# Altium footprint library 方林 封装库.PcbLib: 101 footprints (part 1 of 7)
Each footprint in its own frame and in the unit in brackets; x right, y up, seen from the top. Pads: shape width x height; smd on the part's side, far side on the other; paste and mask are expansions set on the pad; w line width, h text height; cw(c..) or ccw(c..) is an arc to the next point about the centre after c.
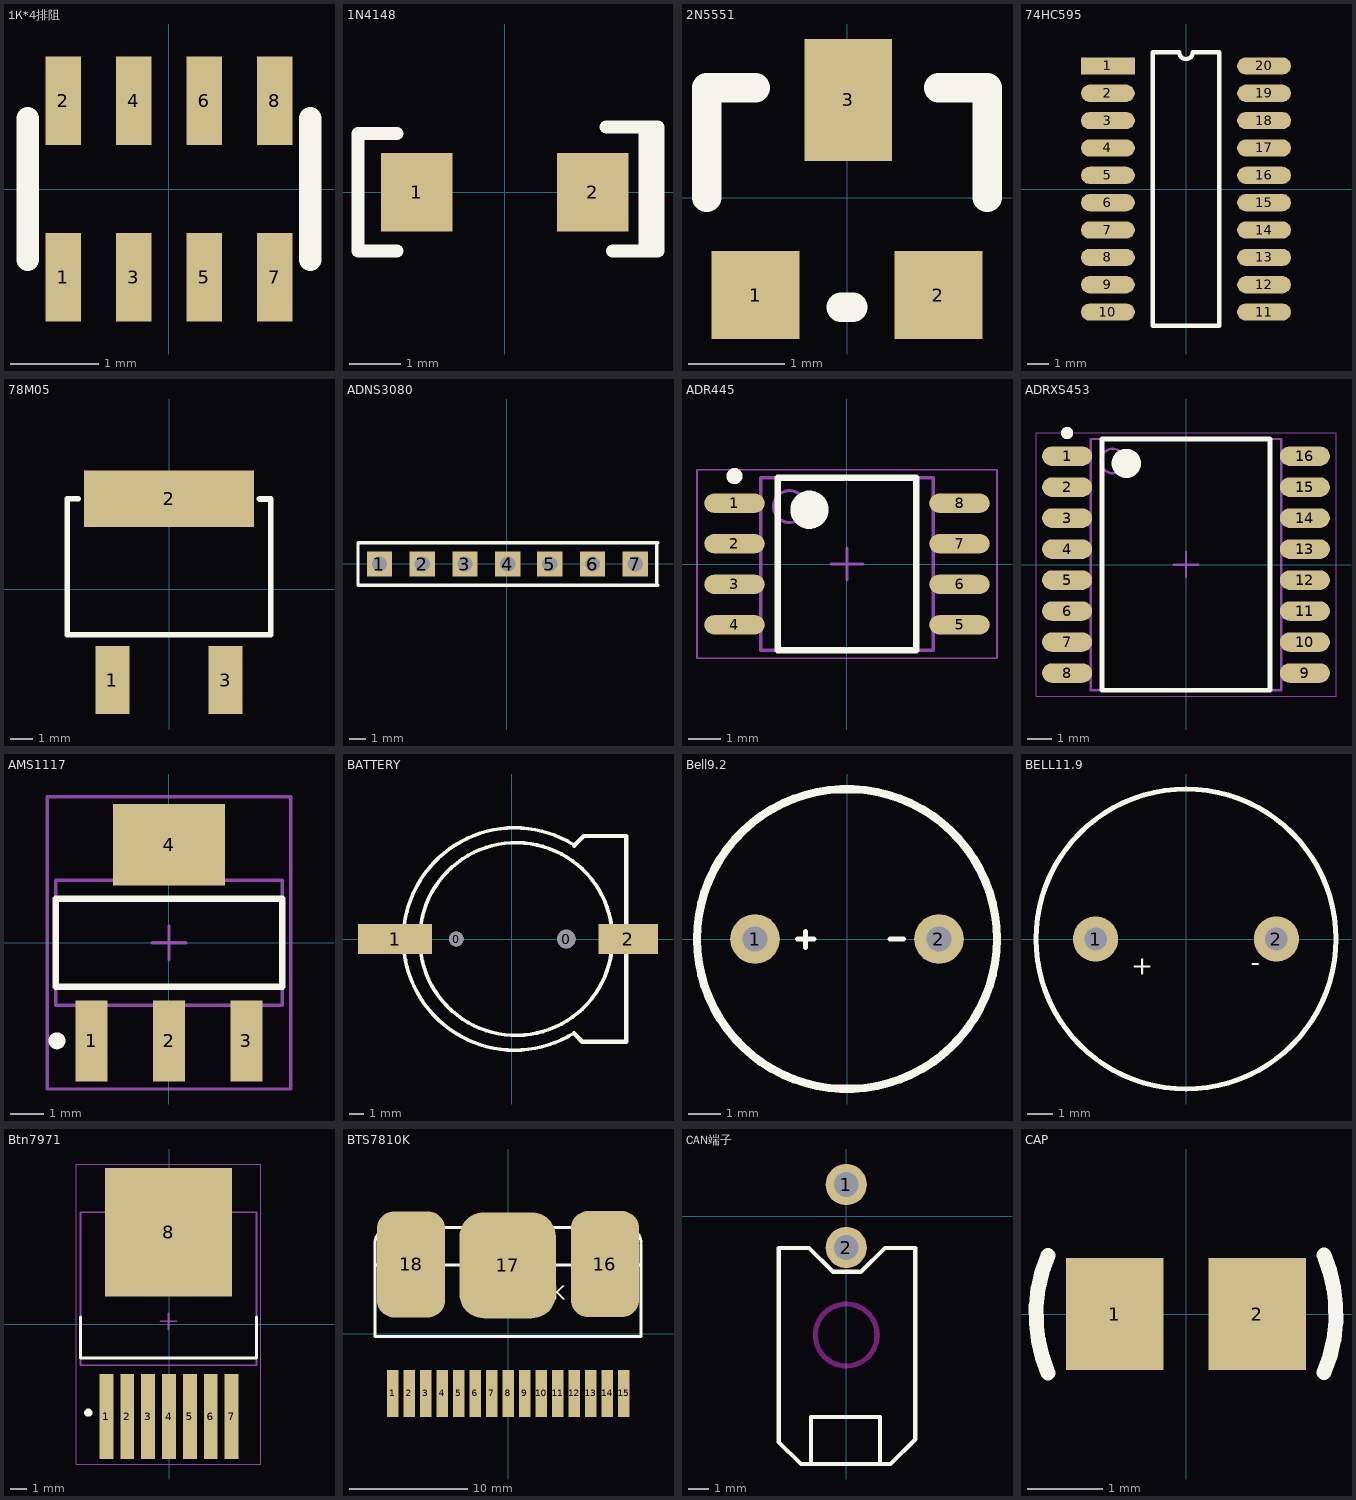
[diagram p0: the footprints below, top view; thin cyan lines are the x and y axes]

## 1K*4排阻 [mm]
pads (8):
  rect 0.4x1 smd: 1(-1.2,-1) 2(-1.2,1) 3(-0.4,-1) 4(-0.4,1) 5(0.4,-1) 6(0.4,1) 7(1.2,-1) 8(1.2,1)
Top Overlay:
  lines w0.254: -1.6,-0.8 -1.6,0.8 ; 1.6,-0.8 1.6,0.8
3D body: height 0.5, standoff 0, extent -1.6,-0.838 1.6,0.838

## 1N4148 [mil]
pads (2):
  rect 55x60 smd: 1(-67.5,0) 2(67.5,0)
Top Overlay:
  lines w10: -82.5,-45 -112.5,-45 -112.5,45 -82.5,45 ; 77.5,50 107.5,50 ; 82.5,-45 107.5,-45 ; 107.5,-45 107.5,50 ; 107.5,-45 117.5,-45 117.5,50 107.5,50
3D body: height 78.74, standoff 0, extent 92.5,-10 102.5,15
3D body: height 78.74, standoff 0, extent -107.5,-10 -97.5,15
3D body: height 78.74, standoff 0, extent -97.5,-35 92.5,40

## 2N5551 [mil]
pads (3):
  rect 36x36 smd: 1(-37.5,-40) 2(37.5,-40)
  rect 36x50 smd: 3(0.5,40)
Top Overlay:
  lines w12: -57.5,0 -57.5,45 -37.5,45 ; -2.5,-45 2.5,-45 ; 37.5,45 57.5,45 57.5,0
3D body "CircuitWorks-SOT-23.step": height 43.91, standoff 0.6, extent -59.55,-44.21 58.56,54.21

## 74HC595 [mm]
pads (20):
  rect 2.5x0.8 smd: 1(-3.625,5.715)
  oval 2.5x0.8 smd: 2(-3.625,4.445) 3(-3.625,3.175) 4(-3.625,1.905) 5(-3.625,0.635) 6(-3.625,-0.635) 7(-3.625,-1.905) 8(-3.625,-3.175) 9(-3.625,-4.445) 10(-3.625,-5.715) 11(3.625,-5.715) 12(3.625,-4.445) 13(3.625,-3.175) 14(3.625,-1.905) 15(3.625,-0.635) 16(3.625,0.635) 17(3.625,1.905) 18(3.625,3.175) 19(3.625,4.445) 20(3.625,5.715)
Top Overlay:
  lines w0.2: -1.54,-6.35 1.54,-6.35 1.54,6.35 0.317,6.35 cw(c0,6.35) -0.318,6.35 -1.54,6.35 -1.54,-6.35

## 78M05 [mil]
pads (3):
  rect 60x120 smd: 1(-100,-160) 3(100,-160)
  rect 300x100 smd: 2(0,160)
Top Overlay:
  lines w10: -160.16,160.16 -180,160.16 ; 160,160 160.16,159.84 180,159.84 180,-80 -180,-80 ; -180,-80 -180,160.16 ; -180,-80 -180,160.16
3D body "D-PAK.STEP": height 90.94, standoff 0, extent -128.92,-181.14 130.92,183.03

## ADNS3080 [mm] "光流"
pads (7):
  rect 1.5x1.5 hole 0.9: 1(-7.544,-0.025) 2(-5.004,-0.025) 3(-2.464,-0.025) 4(0.076,-0.025) 5(2.565,-0.025) 6(5.105,-0.025) 7(7.645,-0.025)
Top Overlay:
  lines w0.2: 1.346,-1.295 -8.814,-1.295 -8.814,1.245 1.346,1.245 ; 1.372,-1.295 8.992,-1.295 ; 1.372,1.245 8.992,1.245 ; 8.915,-1.295 8.915,1.245
3D body "HEADER.STEP": height 7.58, standoff -2.94, extent 6.375,-1.295 8.915,1.245
3D body "HEADER.STEP": height 7.58, standoff -2.94, extent 3.835,-1.295 6.375,1.245
3D body "HEADER.STEP": height 7.58, standoff -2.94, extent 1.295,-1.295 3.835,1.245
3D body "HEADER.STEP": height 7.58, standoff -2.94, extent -1.194,-1.295 1.346,1.245
3D body "HEADER.STEP": height 7.58, standoff -2.94, extent -3.734,-1.295 -1.194,1.245
3D body "HEADER.STEP": height 7.58, standoff -2.94, extent -6.274,-1.295 -3.734,1.245
3D body "HEADER.STEP": height 7.58, standoff -2.94, extent -8.814,-1.295 -6.274,1.245

## ADR445 [mm]
pads (8):
  oval 1.9x0.6 smd: 1(-3.525,1.905) 2(-3.525,0.635) 3(-3.525,-0.635) 4(-3.525,-1.905) 5(3.525,-1.905) 6(3.525,-0.635) 7(3.525,0.635) 8(3.525,1.905)
Top Overlay:
  circle w0.25: c-3.525,2.755 r0.125
  circle w0.6: c-1.175,1.7 r0.3
  lines w0.2: -2.175,-2.7 -2.175,2.7 2.175,2.7 2.175,-2.7 -2.175,-2.7
Mechanical 13:
  circle w0.1: c-1.8,1.8 r0.5
  lines w0.1: -2.7,-2.7 -2.7,2.7 2.7,2.7 2.7,-2.7 -2.7,-2.7
Mechanical 15:
  lines w0.05: -4.7,-2.95 -4.7,2.95 4.7,2.95 4.7,-2.95 -4.7,-2.95
  lines w0.1: -0.5,0 0.5,0 ; 0,-0.5 0,0.5
3D body: height 1.95, standoff 0.15, extent -2.7,-2.7 2.7,2.7

## ADRXS453 [mm]
pads (16):
  oval 2.05x0.8 smd: 1(-4.875,4.445) 2(-4.875,3.175) 3(-4.875,1.905) 4(-4.875,0.635) 5(-4.875,-0.635) 6(-4.875,-1.905) 7(-4.875,-3.175) 8(-4.875,-4.445) 9(4.875,-4.445) 10(4.875,-3.175) 11(4.875,-1.905) 12(4.875,-0.635) 13(4.875,0.635) 14(4.875,1.905) 15(4.875,3.175) 16(4.875,4.445)
Top Overlay:
  circle w0.6: c-2.45,4.15 r0.3
  circle w0.25: c-4.875,5.395 r0.125
  lines w0.2: -3.45,-5.15 3.45,-5.15 3.45,5.15 -3.45,5.15 -3.45,-5.15
Mechanical 13:
  circle w0.1: c-3,4.25 r0.5
  lines w0.1: -3.9,-5.15 3.9,-5.15 3.9,5.15 -3.9,5.15 -3.9,-5.15
Mechanical 15:
  lines w0.05: -6.15,-5.4 6.15,-5.4 6.15,5.4 -6.15,5.4 -6.15,-5.4
  lines w0.1: -0.5,0 0.5,0 ; 0,-0.5 0,0.5
3D body: height 3.43, standoff 0.25, extent -3.9,-5.15 3.9,5.15

## AMS1117 [mm]
pads (4):
  rect 0.95x2.4 smd: 1(-2.29,-2.9) 2(0,-2.9) 3(2.29,-2.9)
  rect 3.3x2.4 smd: 4(0,2.9)
Top Overlay:
  circle w0.25: c-3.315,-2.9 r0.125
  lines w0.2: -3.35,-1.3 3.35,-1.3 3.35,1.3 -3.35,1.3 -3.35,-1.3
Mechanical 13:
  lines w0.1: -3.35,-1.85 3.35,-1.85 3.35,1.85 -3.35,1.85 -3.35,-1.85
Mechanical 15:
  lines w0.1: -0.5,0 0.5,0 ; 0,-0.5 0,0.5 ; -3.6,-4.325 3.6,-4.325 3.6,4.325 -3.6,4.325 -3.6,-4.325
3D body "SOT223-4.STEP": height 1.8, standoff 0, extent -3.35,-3.65 3.35,3.65

## BATTERY [mil]
pads (4):
  round 40 hole 40: 0(-149.61,0)
  round 50 hole 50: 0(147.87,0)
  rect 200x80 smd: 1(-314.96,0)
  rect 160x80 smd: 2(314.96,0)
Top Overlay:
  circle w10: c11.81,0 r260.11
  lines w10: 167.81,254.01 ccw(c7.87,0) 168.01,-253.88
  lines w12: 168.32,251.97 194.4,278.04 309.54,278.04 309.54,0 309.54,-277.07 190.46,-277.07 169.29,-255.91
3D body "cr1220.STEP": height 158.08, standoff -36.4, extent -356.38,-295.69 371.97,294.74

## Bell9.2 [mil]
pads (2):
  round 60 hole 30: 1(-111,0) 2(111,0)
Top Overlay:
  circle w10: c0,0 r181.1
  lines w6: -60,0 -40,0 ; -50,-10 -50,9 ; 52,0 68,0
3D body: height 216.54, standoff 0, extent -181.1,-181.05 181.1,181.05
3D body: height 217.32, standoff 0, extent -31.5,-31.47 31.5,31.47

## BELL11.9 [mil]
pads (2):
  round 70 hole 35: 1(-140,0) 2(140,0)
Top Overlay:
  circle w8: c0,0 r232.28
  text "-" at 100,-50 h30
  text "+" at -85,-55 h30
3D body: height 300, standoff 0, extent -27.43,-30.43 43.43,40.43
3D body: height 299.21, standoff 0, extent -229.28,-237.22 235.29,227.22

## Btn7971 [mm]
pads (8):
  rect 0.85x5.2 smd: 1(-3.84,-5.651) 2(-2.56,-5.651) 3(-1.28,-5.651) 4(0,-5.651) 5(1.28,-5.651) 6(2.56,-5.651) 7(3.84,-5.651)
  rect 7.8x7.9 smd: 8(-0.03,5.651)
Top Overlay:
  circle w0.25: c-4.95,-5.41 r0.125
  lines w0.2: -5.43,0.44 -5.43,-2.06 5.37,-2.06 5.37,0.44
Mechanical 13:
  lines w0.1: -5.43,-2.509 -5.43,6.89 5.37,6.89 5.37,-2.509 -5.43,-2.509
Mechanical 15:
  lines w0.05: -5.68,-8.56 -5.68,9.842 5.62,9.842 5.62,-8.56 -5.68,-8.56
  lines w0.1: -0.53,0.191 0.47,0.191 ; -0.03,-0.31 -0.03,0.69
3D body: height 4.5, standoff 0.6, extent -5.43,-2.509 5.37,6.89

## BTS7810K [mm]
pads (18):
  rect 1x4 smd: 1(-9.8,-5.048) 2(-8.4,-5.048) 3(-7,-5.048) 4(-5.6,-5.048) 5(-4.2,-5.048) 6(-2.8,-5.048) 7(-1.4,-5.048) 8(0,-5.048) 9(1.4,-5.048) 10(2.8,-5.048) 11(4.2,-5.048) 12(5.6,-5.048) 13(7,-5.048) 14(8.4,-5.048) 15(9.8,-5.048)
  rrect50% 5.8x9 smd: 16(8.204,5.918) 18(-8.255,5.893)
  rrect50% 8.18x9 smd: 17(-0.051,5.817)
Top Overlay:
  lines w0.254: 9.97,9.023 -9.724,9.023 ccw(c-9.927,7.626) -11.324,7.83 -11.324,5.849 ; 10.046,9.023 cw(c9.985,7.757) 11.252,7.696 ; 11.165,-0.222 -11.324,-0.222 -11.324,5.849 ; 11.165,5.849 -11.324,5.849 ; 11.282,-0.222 11.282,5.849 11.282,7.59
  text "BTS7810K" at -3.378,2.515 h2
3D body: height 1.27, standoff 0, extent -11.354,5.817 11.278,9.042
3D body: height 2.4, standoff 0, extent -11.341,-0.229 11.252,5.842
3D body: height 1.5, standoff 1, extent -10.363,-2.972 -9.246,-0.229
3D body: height 1.5, standoff 1, extent -8.992,-2.946 -7.823,-0.229
3D body: height 1.5, standoff 1, extent -7.595,-2.946 -6.401,-0.229
3D body: height 1.5, standoff 1, extent -6.198,-2.972 -5.004,-0.229
3D body: height 1.5, standoff 1, extent -4.801,-2.972 -3.607,-0.254
3D body: height 1.5, standoff 1, extent -3.378,-2.972 -2.235,-0.254
3D body: height 1.5, standoff 1, extent -1.956,-2.972 -0.838,-0.254
3D body: height 1.5, standoff 1, extent -0.533,-2.972 0.584,-0.305
3D body: height 1.5, standoff 1, extent 0.864,-2.972 1.956,-0.279
3D body: height 1.5, standoff 1, extent 2.235,-2.972 3.378,-0.229
3D body: height 1.5, standoff 1, extent 3.632,-2.972 4.775,-0.279
3D body: height 1.5, standoff 1, extent 5.055,-2.972 6.172,-0.279
3D body: height 1.5, standoff 1, extent 6.452,-2.972 7.569,-0.279
3D body: height 1.5, standoff 1, extent 7.849,-2.972 8.966,-0.279
3D body: height 1.5, standoff 1, extent 9.246,-2.972 10.338,-0.229
3D body: height 1.5, standoff 0, extent -10.312,-3.15 -9.246,-2.972
3D body: height 1.5, standoff 0, extent -8.992,-3.15 -7.823,-2.946
3D body: height 1.5, standoff 0, extent -7.595,-3.15 -6.401,-2.946
3D body: height 1.5, standoff 0, extent -6.198,-3.15 -5.004,-2.972
3D body: height 1.5, standoff 0, extent -4.801,-3.15 -3.607,-2.972
3D body: height 1.5, standoff 0, extent -3.378,-3.15 -2.235,-2.972
3D body: height 1.5, standoff 0, extent -1.956,-3.124 -0.838,-2.972
3D body: height 1.5, standoff 0, extent -0.533,-3.124 0.584,-2.972
3D body: height 1.5, standoff 0, extent 0.864,-3.124 1.956,-2.972
3D body: height 1.5, standoff 0, extent 2.235,-3.15 3.378,-2.972
3D body: height 1.5, standoff 0, extent 3.632,-3.15 4.775,-2.972
3D body: height 1.5, standoff 0, extent 5.055,-3.15 6.172,-2.972
3D body: height 1.5, standoff 0, extent 6.452,-3.175 7.569,-2.972
3D body: height 1.5, standoff 0, extent 7.849,-3.175 8.966,-2.972
3D body: height 1.5, standoff 0, extent 9.246,-3.15 10.338,-2.972
3D body: height 0.6, standoff 0, extent -10.338,-7.061 -9.246,-3.15
3D body: height 0.6, standoff 0, extent -8.992,-7.112 -7.823,-3.15
3D body: height 0.6, standoff 0, extent -7.595,-7.112 -6.401,-3.15
3D body: height 0.6, standoff 0, extent -6.198,-7.112 -5.004,-3.15
3D body: height 0.6, standoff 0, extent -4.801,-7.087 -3.607,-3.15
3D body: height 0.6, standoff 0, extent -3.378,-7.112 -2.235,-3.15
3D body: height 0.6, standoff 0, extent -1.956,-7.087 -0.838,-3.124
3D body: height 0.6, standoff 0, extent -0.533,-7.112 0.584,-3.124
3D body: height 0.6, standoff 0, extent 0.864,-7.087 1.956,-3.124
3D body: height 0.6, standoff 0, extent 2.235,-7.087 3.378,-3.15
3D body: height 0.6, standoff 0, extent 3.632,-7.112 4.775,-3.15
3D body: height 0.6, standoff 0, extent 5.055,-7.087 6.172,-3.15
3D body: height 0.6, standoff 0, extent 6.452,-7.087 7.569,-3.175
3D body: height 0.6, standoff 0, extent 7.849,-7.061 8.966,-3.175
3D body: height 0.6, standoff 0, extent 9.246,-7.112 10.338,-3.15

## CAN端子 [mm]
pads (2):
  round 2 hole 1.2: 1(0,1.525) 2(0,-1.525)
Top Overlay:
  lines w0.2: -1.7,-11.925 -1.7,-9.74 1.642,-9.74 1.642,-12.025 ; -3.275,-10.95 -2.2,-12.025 2.15,-12.025 3.35,-10.825 3.35,-1.55 1.875,-1.55 0.725,-2.7 -0.65,-2.7 -1.8,-1.55 -3.275,-1.55 -3.275,-10.95
Keep-Out Layer:
  circle w0.254: c0,-5.768 r1.5
3D body: height 0, standoff -1.27, extent -0.381,1.144 0.381,1.906
3D body: height 0, standoff -1.27, extent -0.381,-1.906 0.381,-1.144
3D body: height 2.41, standoff 1.65, extent -0.381,-2.795 0.381,-1.525
3D body: height 5.71, standoff 4.95, extent -0.408,-2.83 0.354,1.742
3D body: height 2.03, standoff 0, extent -0.381,-1.906 0.381,-1.144
3D body: height 5.33, standoff 0, extent -0.381,1.144 0.381,1.906
3D body: height 7.11, standoff 0, extent -3.202,-12.101 3.275,-1.56

## CAP [mm]
pads (2):
  rect 1.3x1.5 smd: 1(-0.95,0) 2(0.95,0)
Top Overlay:
  lines w0.2: -1.842,0.779 ccw(c0,0) -1.838,-0.789 ; 1.838,0.789 cw(c0,0) 1.842,-0.779
3D body: height 0.8, standoff 0, extent -1.016,-0.635 1.016,0.635
3D body: height 0.9, standoff 0, extent -1.27,-0.635 -0.889,0.635
3D body: height 0.9, standoff 0, extent 0.889,-0.635 1.27,0.635